# Altium footprint library ALL.PcbLib: 385 footprints (part 10 of 25)
Each footprint in its own frame and in the unit in brackets; x right, y up, seen from the top. Pads: shape width x height; smd on the part's side, far side on the other; paste and mask are expansions set on the pad; w line width, h text height; cw(c..) or ccw(c..) is an arc to the next point about the centre after c.
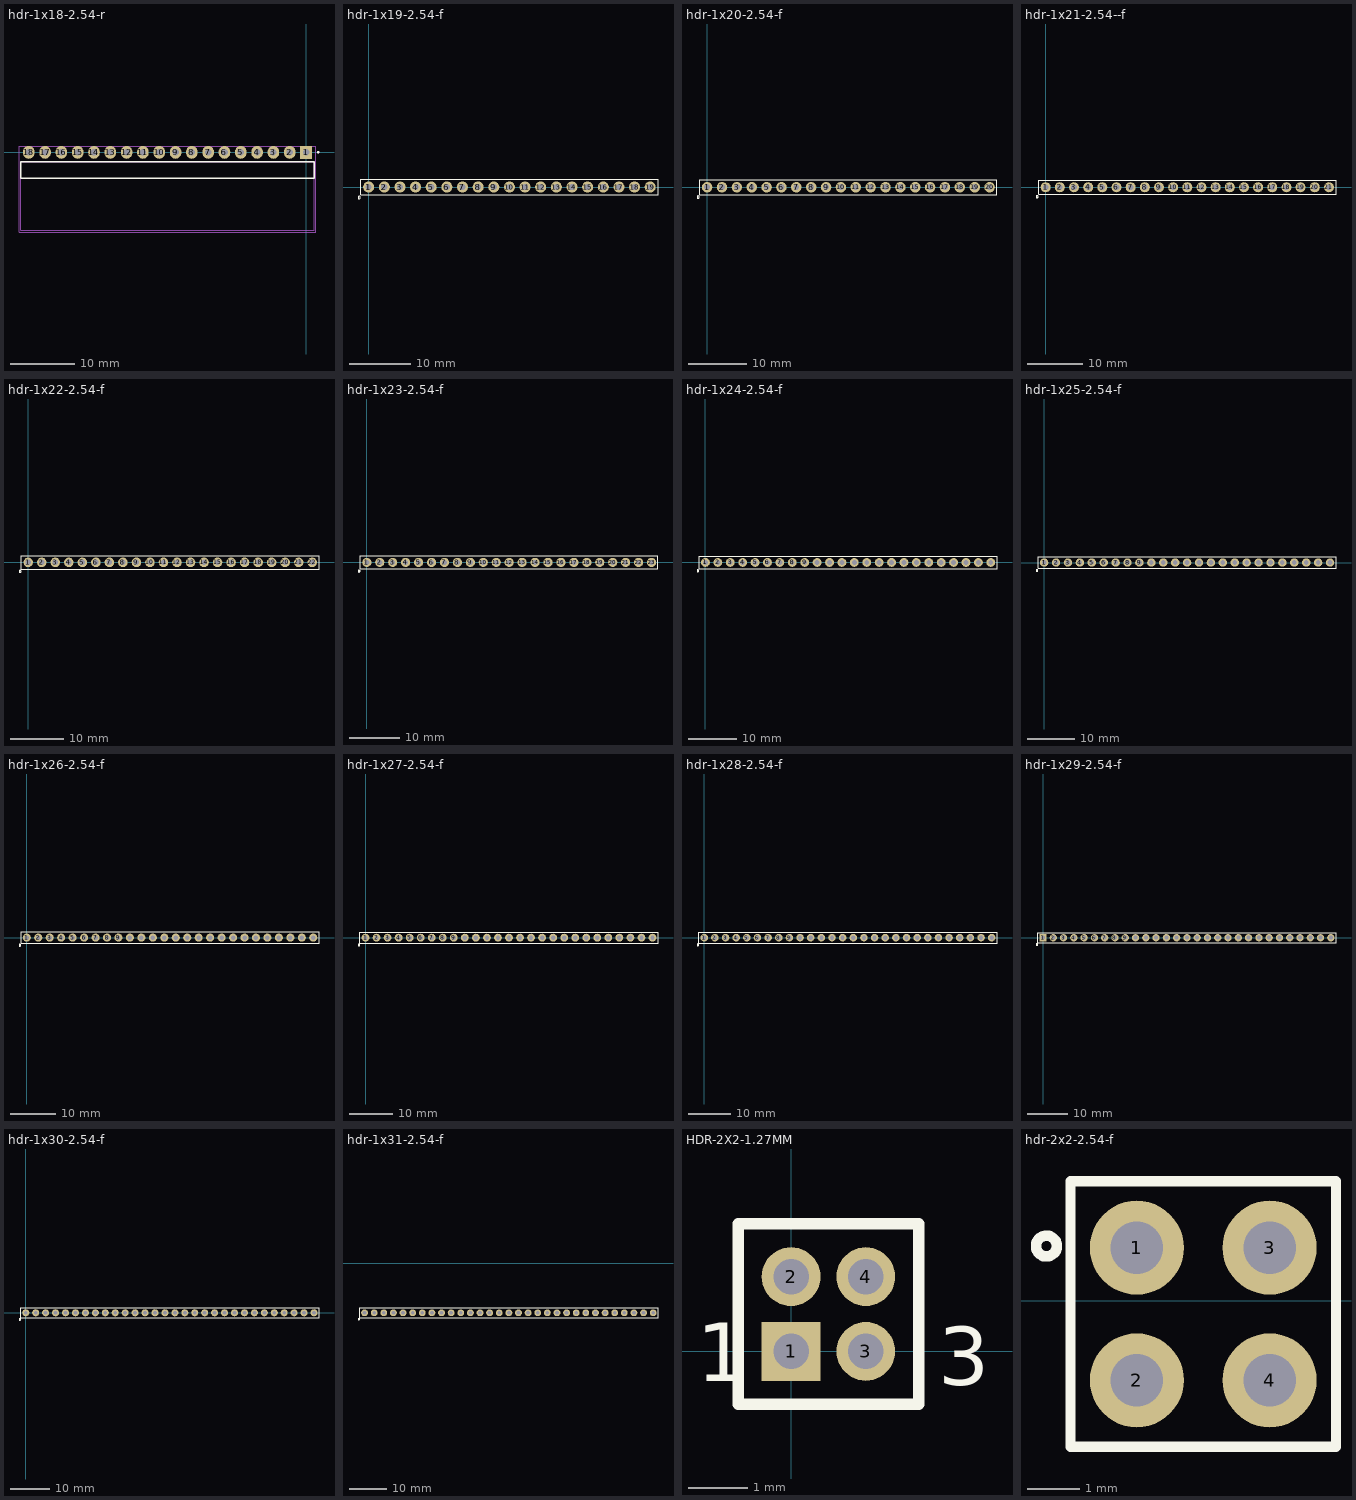
[diagram p9: the footprints below, top view; thin cyan lines are the x and y axes]

## hdr-1x18-2.54-r [mm]
pads (18):
  rect 1.8x2 hole 1.02: 1(0,0)
  oval 1.8x2 hole 1.02: 2(-2.54,0) 3(-5.08,0) 4(-7.62,0) 5(-10.16,0) 6(-12.7,0) 7(-15.24,0) 8(-17.78,0) 9(-20.32,0) 10(-22.86,0) 11(-25.4,0) 12(-27.94,0) 13(-30.48,0) 14(-33.02,0) 15(-35.56,0) 16(-38.1,0) 17(-40.64,0) 18(-43.18,0)
Top Overlay:
  circle w0.2: c1.92,0 r0.1
  lines w0.2: -44.45,-4.04 -44.45,-1.5 1.27,-1.5 1.27,-4.04 -44.45,-4.04
Mechanical 13:
  circle w0.2: c1.92,0 r0.1
  lines w0.1: -44.45,-4.04 -44.45,-1.5 1.27,-1.5 1.27,-4.04 ; -44.45,-4.04 1.27,-4.04 ; -44.45,-4.04 -44.45,-12.17 1.27,-12.17 1.27,-4.04
Mechanical 15:
  lines w0.05: -44.7,-12.42 -44.7,0.935 1.52,0.935 1.52,-12.42 -44.7,-12.42
3D body "TSW-118-16-G-S-RA.stp": height 3.27, standoff -4.83, extent -44.577,-12.065 1.143,0.445

## hdr-1x19-2.54-f [mm]
pads (19):
  round 1.8 hole 1: 1(0,0) 2(2.54,0) 3(5.08,0) 4(7.62,0) 5(10.16,0) 6(12.7,0) 7(15.24,0) 8(17.78,0) 9(20.32,0) 10(22.86,0) 11(25.4,0) 12(27.94,0) 13(30.48,0) 14(33.02,0) 15(35.56,0) 16(38.1,0) 17(40.64,0) 18(43.18,0) 19(45.72,0)
Top Overlay:
  circle w0.2: c-1.53,-1.7 r0.2
  lines w0.2: -1.27,-1.27 46.99,-1.27 46.99,1.27 -1.27,1.27 -1.27,-1.27
3D body "PBS-1.stp": height 8.5, standoff -3.15, extent 44.45,-1.27 46.99,1.27
3D body "PBD-2.stp": height 8.5, standoff -3.15, extent -1.27,-1.27 3.81,1.27
3D body "PBD-2.stp": height 8.5, standoff -3.15, extent 3.81,-1.27 8.89,1.27
3D body "PBD-2.stp": height 8.5, standoff -3.15, extent 8.89,-1.27 13.97,1.27
3D body "PBD-2.stp": height 8.5, standoff -3.15, extent 13.97,-1.27 19.05,1.27
3D body "PBD-2.stp": height 8.5, standoff -3.15, extent 19.05,-1.27 24.13,1.27
3D body "PBD-2.stp": height 8.5, standoff -3.15, extent 24.13,-1.27 29.21,1.27
3D body "PBD-2.stp": height 8.5, standoff -3.15, extent 29.21,-1.27 34.29,1.27
3D body "PBD-2.stp": height 8.5, standoff -3.15, extent 34.29,-1.27 39.37,1.27
3D body "PBD-2.stp": height 8.5, standoff -3.15, extent 39.37,-1.27 44.45,1.27

## hdr-1x20-2.54-f [mm]
pads (20):
  round 1.8 hole 1: 1(0,0) 2(2.54,0) 3(5.08,0) 4(7.62,0) 5(10.16,0) 6(12.7,0) 7(15.24,0) 8(17.78,0) 9(20.32,0) 10(22.86,0) 11(25.4,0) 12(27.94,0) 13(30.48,0) 14(33.02,0) 15(35.56,0) 16(38.1,0) 17(40.64,0) 18(43.18,0) 19(45.72,0) 20(48.26,0)
Top Overlay:
  circle w0.2: c-1.53,-1.7 r0.2
  lines w0.2: -1.27,-1.27 49.53,-1.27 49.53,1.27 -1.27,1.27 -1.27,-1.27
3D body "PBD-2.stp": height 8.5, standoff -3.15, extent -1.27,-1.27 3.81,1.27
3D body "PBD-2.stp": height 8.5, standoff -3.15, extent 3.81,-1.27 8.89,1.27
3D body "PBD-2.stp": height 8.5, standoff -3.15, extent 8.89,-1.27 13.97,1.27
3D body "PBD-2.stp": height 8.5, standoff -3.15, extent 13.97,-1.27 19.05,1.27
3D body "PBD-2.stp": height 8.5, standoff -3.15, extent 19.05,-1.27 24.13,1.27
3D body "PBD-2.stp": height 8.5, standoff -3.15, extent 24.13,-1.27 29.21,1.27
3D body "PBD-2.stp": height 8.5, standoff -3.15, extent 29.21,-1.27 34.29,1.27
3D body "PBD-2.stp": height 8.5, standoff -3.15, extent 34.29,-1.27 39.37,1.27
3D body "PBD-2.stp": height 8.5, standoff -3.15, extent 39.37,-1.27 44.45,1.27
3D body "PBD-2.stp": height 8.5, standoff -3.15, extent 44.45,-1.27 49.53,1.27

## hdr-1x21-2.54--f [mm]
pads (21):
  round 1.8 hole 1: 1(0,0) 2(2.54,0) 3(5.08,0) 4(7.62,0) 5(10.16,0) 6(12.7,0) 7(15.24,0) 8(17.78,0) 9(20.32,0) 10(22.86,0) 11(25.4,0) 12(27.94,0) 13(30.48,0) 14(33.02,0) 15(35.56,0) 16(38.1,0) 17(40.64,0) 18(43.18,0) 19(45.72,0) 20(48.26,0) 21(50.8,0)
Top Overlay:
  circle w0.2: c-1.53,-1.7 r0.2
  lines w0.2: -1.27,-1.27 52.07,-1.27 52.07,1.27 -1.27,1.27 -1.27,-1.27
3D body "PBS-1.stp": height 8.5, standoff -3.15, extent 49.53,-1.27 52.07,1.27
3D body "PBD-2.stp": height 8.5, standoff -3.15, extent -1.27,-1.27 3.81,1.27
3D body "PBD-2.stp": height 8.5, standoff -3.15, extent 3.81,-1.27 8.89,1.27
3D body "PBD-2.stp": height 8.5, standoff -3.15, extent 8.89,-1.27 13.97,1.27
3D body "PBD-2.stp": height 8.5, standoff -3.15, extent 13.97,-1.27 19.05,1.27
3D body "PBD-2.stp": height 8.5, standoff -3.15, extent 19.05,-1.27 24.13,1.27
3D body "PBD-2.stp": height 8.5, standoff -3.15, extent 24.13,-1.27 29.21,1.27
3D body "PBD-2.stp": height 8.5, standoff -3.15, extent 29.21,-1.27 34.29,1.27
3D body "PBD-2.stp": height 8.5, standoff -3.15, extent 34.29,-1.27 39.37,1.27
3D body "PBD-2.stp": height 8.5, standoff -3.15, extent 39.37,-1.27 44.45,1.27
3D body "PBD-2.stp": height 8.5, standoff -3.15, extent 44.45,-1.27 49.53,1.27

## hdr-1x22-2.54-f [mm]
pads (22):
  round 1.8 hole 1: 1(0,0) 2(2.54,0) 3(5.08,0) 4(7.62,0) 5(10.16,0) 6(12.7,0) 7(15.24,0) 8(17.78,0) 9(20.32,0) 10(22.86,0) 11(25.4,0) 12(27.94,0) 13(30.48,0) 14(33.02,0) 15(35.56,0) 16(38.1,0) 17(40.64,0) 18(43.18,0) 19(45.72,0) 20(48.26,0) 21(50.8,0) 22(53.34,0)
Top Overlay:
  circle w0.2: c-1.53,-1.7 r0.2
  lines w0.2: -1.27,-1.27 -1.27,1.27 54.61,1.27 54.61,-1.27 -1.27,-1.27
3D body "PBD-2.stp": height 8.5, standoff -3.15, extent 49.53,-1.27 54.61,1.27
3D body "PBD-2.stp": height 8.5, standoff -3.15, extent 44.45,-1.27 49.53,1.27
3D body "PBD-2.stp": height 8.5, standoff -3.15, extent 39.37,-1.27 44.45,1.27
3D body "PBD-2.stp": height 8.5, standoff -3.15, extent 34.29,-1.27 39.37,1.27
3D body "PBD-2.stp": height 8.5, standoff -3.15, extent 29.21,-1.27 34.29,1.27
3D body "PBD-2.stp": height 8.5, standoff -3.15, extent 24.13,-1.27 29.21,1.27
3D body "PBD-2.stp": height 8.5, standoff -3.15, extent 19.05,-1.27 24.13,1.27
3D body "PBD-2.stp": height 8.5, standoff -3.15, extent 13.97,-1.27 19.05,1.27
3D body "PBD-2.stp": height 8.5, standoff -3.15, extent 8.89,-1.27 13.97,1.27
3D body "PBD-2.stp": height 8.5, standoff -3.15, extent 3.81,-1.27 8.89,1.27
3D body "PBD-2.stp": height 8.5, standoff -3.15, extent -1.27,-1.27 3.81,1.27

## hdr-1x23-2.54-f [mm]
pads (23):
  round 1.8 hole 1: 1(0,0) 2(2.54,0) 3(5.08,0) 4(7.62,0) 5(10.16,0) 6(12.7,0) 7(15.24,0) 8(17.78,0) 9(20.32,0) 10(22.86,0) 11(25.4,0) 12(27.94,0) 13(30.48,0) 14(33.02,0) 15(35.56,0) 16(38.1,0) 17(40.64,0) 18(43.18,0) 19(45.72,0) 20(48.26,0) 21(50.8,0) 22(53.34,0) 23(55.88,0)
Top Overlay:
  circle w0.2: c-1.53,-1.7 r0.2
  lines w0.2: -1.27,-1.27 57.15,-1.27 57.15,1.27 -1.27,1.27 -1.27,-1.27
3D body "PBS-1.stp": height 8.5, standoff -3.15, extent 54.61,-1.27 57.15,1.27
3D body "PBD-2.stp": height 8.5, standoff -3.15, extent -1.27,-1.27 3.81,1.27
3D body "PBD-2.stp": height 8.5, standoff -3.15, extent 3.81,-1.27 8.89,1.27
3D body "PBD-2.stp": height 8.5, standoff -3.15, extent 8.89,-1.27 13.97,1.27
3D body "PBD-2.stp": height 8.5, standoff -3.15, extent 13.97,-1.27 19.05,1.27
3D body "PBD-2.stp": height 8.5, standoff -3.15, extent 19.05,-1.27 24.13,1.27
3D body "PBD-2.stp": height 8.5, standoff -3.15, extent 24.13,-1.27 29.21,1.27
3D body "PBD-2.stp": height 8.5, standoff -3.15, extent 29.21,-1.27 34.29,1.27
3D body "PBD-2.stp": height 8.5, standoff -3.15, extent 34.29,-1.27 39.37,1.27
3D body "PBD-2.stp": height 8.5, standoff -3.15, extent 39.37,-1.27 44.45,1.27
3D body "PBD-2.stp": height 8.5, standoff -3.15, extent 44.45,-1.27 49.53,1.27
3D body "PBD-2.stp": height 8.5, standoff -3.15, extent 49.53,-1.27 54.61,1.27

## hdr-1x24-2.54-f [mm]
pads (24):
  round 1.8 hole 1: 1(0,0) 2(2.54,0) 3(5.08,0) 4(7.62,0) 5(10.16,0) 6(12.7,0) 7(15.24,0) 8(17.78,0) 9(20.32,0) 10(22.86,0) 11(25.4,0) 12(27.94,0) 13(30.48,0) 14(33.02,0) 15(35.56,0) 16(38.1,0) 17(40.64,0) 18(43.18,0) 19(45.72,0) 20(48.26,0) 21(50.8,0) 22(53.34,0) 23(55.88,0) 24(58.42,0)
Top Overlay:
  circle w0.2: c-1.53,-1.7 r0.2
  lines w0.2: -1.27,-1.27 59.69,-1.27 59.69,1.27 -1.27,1.27 -1.27,-1.27
3D body "PBD-2.stp": height 8.5, standoff -3.15, extent -1.27,-1.27 3.81,1.27
3D body "PBD-2.stp": height 8.5, standoff -3.15, extent 3.81,-1.27 8.89,1.27
3D body "PBD-2.stp": height 8.5, standoff -3.15, extent 8.89,-1.27 13.97,1.27
3D body "PBD-2.stp": height 8.5, standoff -3.15, extent 13.97,-1.27 19.05,1.27
3D body "PBD-2.stp": height 8.5, standoff -3.15, extent 19.05,-1.27 24.13,1.27
3D body "PBD-2.stp": height 8.5, standoff -3.15, extent 24.13,-1.27 29.21,1.27
3D body "PBD-2.stp": height 8.5, standoff -3.15, extent 29.21,-1.27 34.29,1.27
3D body "PBD-2.stp": height 8.5, standoff -3.15, extent 34.29,-1.27 39.37,1.27
3D body "PBD-2.stp": height 8.5, standoff -3.15, extent 39.37,-1.27 44.45,1.27
3D body "PBD-2.stp": height 8.5, standoff -3.15, extent 44.45,-1.27 49.53,1.27
3D body "PBD-2.stp": height 8.5, standoff -3.15, extent 49.53,-1.27 54.61,1.27
3D body "PBD-2.stp": height 8.5, standoff -3.15, extent 54.61,-1.27 59.69,1.27

## hdr-1x25-2.54-f [mm]
pads (25):
  round 1.8 hole 1: 1(0,0) 2(2.54,0) 3(5.08,0) 4(7.62,0) 5(10.16,0) 6(12.7,0) 7(15.24,0) 8(17.78,0) 9(20.32,0) 10(22.86,0) 11(25.4,0) 12(27.94,0) 13(30.48,0) 14(33.02,0) 15(35.56,0) 16(38.1,0) 17(40.64,0) 18(43.18,0) 19(45.72,0) 20(48.26,0) 21(50.8,0) 22(53.34,0) 23(55.88,0) 24(58.42,0) 25(60.96,0)
Top Overlay:
  circle w0.2: c-1.53,-1.7 r0.2
  lines w0.2: -1.27,-1.27 62.23,-1.27 62.23,1.27 -1.27,1.27 -1.27,-1.27
3D body "PBD-2.stp": height 8.5, standoff -3.15, extent 54.61,-1.27 59.69,1.27
3D body "PBD-2.stp": height 8.5, standoff -3.15, extent 49.53,-1.27 54.61,1.27
3D body "PBD-2.stp": height 8.5, standoff -3.15, extent 44.45,-1.27 49.53,1.27
3D body "PBD-2.stp": height 8.5, standoff -3.15, extent 39.37,-1.27 44.45,1.27
3D body "PBD-2.stp": height 8.5, standoff -3.15, extent 34.29,-1.27 39.37,1.27
3D body "PBD-2.stp": height 8.5, standoff -3.15, extent 29.21,-1.27 34.29,1.27
3D body "PBD-2.stp": height 8.5, standoff -3.15, extent 24.13,-1.27 29.21,1.27
3D body "PBD-2.stp": height 8.5, standoff -3.15, extent 19.05,-1.27 24.13,1.27
3D body "PBD-2.stp": height 8.5, standoff -3.15, extent 13.97,-1.27 19.05,1.27
3D body "PBD-2.stp": height 8.5, standoff -3.15, extent 8.89,-1.27 13.97,1.27
3D body "PBD-2.stp": height 8.5, standoff -3.15, extent 3.81,-1.27 8.89,1.27
3D body "PBD-2.stp": height 8.5, standoff -3.15, extent -1.27,-1.27 3.81,1.27
3D body "PBS-1.stp": height 8.5, standoff -3.15, extent 59.69,-1.27 62.23,1.27

## hdr-1x26-2.54-f [mm]
pads (26):
  round 1.8 hole 1: 1(0,0) 2(2.54,0) 3(5.08,0) 4(7.62,0) 5(10.16,0) 6(12.7,0) 7(15.24,0) 8(17.78,0) 9(20.32,0) 10(22.86,0) 11(25.4,0) 12(27.94,0) 13(30.48,0) 14(33.02,0) 15(35.56,0) 16(38.1,0) 17(40.64,0) 18(43.18,0) 19(45.72,0) 20(48.26,0) 21(50.8,0) 22(53.34,0) 23(55.88,0) 24(58.42,0) 25(60.96,0) 26(63.5,0)
Top Overlay:
  circle w0.2: c-1.53,-1.7 r0.2
  lines w0.2: -1.27,-1.27 -1.27,1.27 64.77,1.27 64.77,-1.27 -1.27,-1.27
3D body "PBD-2.stp": height 8.5, standoff -3.15, extent 59.69,-1.27 64.77,1.27
3D body "PBD-2.stp": height 8.5, standoff -3.15, extent 54.61,-1.27 59.69,1.27
3D body "PBD-2.stp": height 8.5, standoff -3.15, extent 49.53,-1.27 54.61,1.27
3D body "PBD-2.stp": height 8.5, standoff -3.15, extent 44.45,-1.27 49.53,1.27
3D body "PBD-2.stp": height 8.5, standoff -3.15, extent 39.37,-1.27 44.45,1.27
3D body "PBD-2.stp": height 8.5, standoff -3.15, extent 34.29,-1.27 39.37,1.27
3D body "PBD-2.stp": height 8.5, standoff -3.15, extent 29.21,-1.27 34.29,1.27
3D body "PBD-2.stp": height 8.5, standoff -3.15, extent 24.13,-1.27 29.21,1.27
3D body "PBD-2.stp": height 8.5, standoff -3.15, extent 19.05,-1.27 24.13,1.27
3D body "PBD-2.stp": height 8.5, standoff -3.15, extent 13.97,-1.27 19.05,1.27
3D body "PBD-2.stp": height 8.5, standoff -3.15, extent 8.89,-1.27 13.97,1.27
3D body "PBD-2.stp": height 8.5, standoff -3.15, extent 3.81,-1.27 8.89,1.27
3D body "PBD-2.stp": height 8.5, standoff -3.15, extent -1.27,-1.27 3.81,1.27

## hdr-1x27-2.54-f [mm]
pads (27):
  round 1.8 hole 1: 1(0,0) 2(2.54,0) 3(5.08,0) 4(7.62,0) 5(10.16,0) 6(12.7,0) 7(15.24,0) 8(17.78,0) 9(20.32,0) 10(22.86,0) 11(25.4,0) 12(27.94,0) 13(30.48,0) 14(33.02,0) 15(35.56,0) 16(38.1,0) 17(40.64,0) 18(43.18,0) 19(45.72,0) 20(48.26,0) 21(50.8,0) 22(53.34,0) 23(55.88,0) 24(58.42,0) 25(60.96,0) 26(63.5,0) 27(66.04,0)
Top Overlay:
  circle w0.2: c-1.53,-1.7 r0.2
  lines w0.2: -1.27,-1.27 -1.27,1.27 67.31,1.27 67.31,-1.27 -1.27,-1.27
3D body "PBD-2.stp": height 8.5, standoff -3.15, extent -1.27,-1.27 3.81,1.27
3D body "PBD-2.stp": height 8.5, standoff -3.15, extent 3.81,-1.27 8.89,1.27
3D body "PBD-2.stp": height 8.5, standoff -3.15, extent 8.89,-1.27 13.97,1.27
3D body "PBD-2.stp": height 8.5, standoff -3.15, extent 13.97,-1.27 19.05,1.27
3D body "PBD-2.stp": height 8.5, standoff -3.15, extent 19.05,-1.27 24.13,1.27
3D body "PBD-2.stp": height 8.5, standoff -3.15, extent 24.13,-1.27 29.21,1.27
3D body "PBD-2.stp": height 8.5, standoff -3.15, extent 29.21,-1.27 34.29,1.27
3D body "PBD-2.stp": height 8.5, standoff -3.15, extent 34.29,-1.27 39.37,1.27
3D body "PBD-2.stp": height 8.5, standoff -3.15, extent 39.37,-1.27 44.45,1.27
3D body "PBD-2.stp": height 8.5, standoff -3.15, extent 44.45,-1.27 49.53,1.27
3D body "PBD-2.stp": height 8.5, standoff -3.15, extent 49.53,-1.27 54.61,1.27
3D body "PBD-2.stp": height 8.5, standoff -3.15, extent 54.61,-1.27 59.69,1.27
3D body "PBD-2.stp": height 8.5, standoff -3.15, extent 59.69,-1.27 64.77,1.27
3D body "PBS-1.stp": height 8.5, standoff -3.15, extent 64.77,-1.27 67.31,1.27

## hdr-1x28-2.54-f [mm]
pads (28):
  round 1.8 hole 1: 1(0,0) 2(2.54,0) 3(5.08,0) 4(7.62,0) 5(10.16,0) 6(12.7,0) 7(15.24,0) 8(17.78,0) 9(20.32,0) 10(22.86,0) 11(25.4,0) 12(27.94,0) 13(30.48,0) 14(33.02,0) 15(35.56,0) 16(38.1,0) 17(40.64,0) 18(43.18,0) 19(45.72,0) 20(48.26,0) 21(50.8,0) 22(53.34,0) 23(55.88,0) 24(58.42,0) 25(60.96,0) 26(63.5,0) 27(66.04,0) 28(68.58,0)
Top Overlay:
  circle w0.2: c-1.53,-1.7 r0.2
  lines w0.2: -1.27,-1.27 -1.27,1.27 69.85,1.27 69.85,-1.27 -1.27,-1.27
3D body "PBD-2.stp": height 8.5, standoff -3.15, extent 64.77,-1.27 69.85,1.27
3D body "PBD-2.stp": height 8.5, standoff -3.15, extent 59.69,-1.27 64.77,1.27
3D body "PBD-2.stp": height 8.5, standoff -3.15, extent 54.61,-1.27 59.69,1.27
3D body "PBD-2.stp": height 8.5, standoff -3.15, extent 49.53,-1.27 54.61,1.27
3D body "PBD-2.stp": height 8.5, standoff -3.15, extent 44.45,-1.27 49.53,1.27
3D body "PBD-2.stp": height 8.5, standoff -3.15, extent 39.37,-1.27 44.45,1.27
3D body "PBD-2.stp": height 8.5, standoff -3.15, extent 34.29,-1.27 39.37,1.27
3D body "PBD-2.stp": height 8.5, standoff -3.15, extent 29.21,-1.27 34.29,1.27
3D body "PBD-2.stp": height 8.5, standoff -3.15, extent 24.13,-1.27 29.21,1.27
3D body "PBD-2.stp": height 8.5, standoff -3.15, extent 19.05,-1.27 24.13,1.27
3D body "PBD-2.stp": height 8.5, standoff -3.15, extent 13.97,-1.27 19.05,1.27
3D body "PBD-2.stp": height 8.5, standoff -3.15, extent 8.89,-1.27 13.97,1.27
3D body "PBD-2.stp": height 8.5, standoff -3.15, extent 3.81,-1.27 8.89,1.27
3D body "PBD-2.stp": height 8.5, standoff -3.15, extent -1.27,-1.27 3.81,1.27

## hdr-1x29-2.54-f [mm]
pads (29):
  rect 1.8x1.8 hole 1: 1(0,0)
  round 1.8 hole 1: 2(2.54,0) 3(5.08,0) 4(7.62,0) 5(10.16,0) 6(12.7,0) 7(15.24,0) 8(17.78,0) 9(20.32,0) 10(22.86,0) 11(25.4,0) 12(27.94,0) 13(30.48,0) 14(33.02,0) 15(35.56,0) 16(38.1,0) 17(40.64,0) 18(43.18,0) 19(45.72,0) 20(48.26,0) 21(50.8,0) 22(53.34,0) 23(55.88,0) 24(58.42,0) 25(60.96,0) 26(63.5,0) 27(66.04,0) 28(68.58,0) 29(71.12,0)
Top Overlay:
  circle w0.2: c-1.53,-1.7 r0.2
  lines w0.2: -1.27,-1.27 -1.27,1.27 72.39,1.27 72.39,-1.27 -1.27,-1.27
3D body "PBD-2.stp": height 8.5, standoff -3.15, extent 64.77,-1.27 69.85,1.27
3D body "PBD-2.stp": height 8.5, standoff -3.15, extent 59.69,-1.27 64.77,1.27
3D body "PBD-2.stp": height 8.5, standoff -3.15, extent 54.61,-1.27 59.69,1.27
3D body "PBD-2.stp": height 8.5, standoff -3.15, extent 49.53,-1.27 54.61,1.27
3D body "PBD-2.stp": height 8.5, standoff -3.15, extent 44.45,-1.27 49.53,1.27
3D body "PBD-2.stp": height 8.5, standoff -3.15, extent 39.37,-1.27 44.45,1.27
3D body "PBD-2.stp": height 8.5, standoff -3.15, extent 34.29,-1.27 39.37,1.27
3D body "PBD-2.stp": height 8.5, standoff -3.15, extent 29.21,-1.27 34.29,1.27
3D body "PBD-2.stp": height 8.5, standoff -3.15, extent 24.13,-1.27 29.21,1.27
3D body "PBD-2.stp": height 8.5, standoff -3.15, extent 19.05,-1.27 24.13,1.27
3D body "PBD-2.stp": height 8.5, standoff -3.15, extent 13.97,-1.27 19.05,1.27
3D body "PBD-2.stp": height 8.5, standoff -3.15, extent 8.89,-1.27 13.97,1.27
3D body "PBD-2.stp": height 8.5, standoff -3.15, extent 3.81,-1.27 8.89,1.27
3D body "PBD-2.stp": height 8.5, standoff -3.15, extent -1.27,-1.27 3.81,1.27
3D body "PBS-1.stp": height 8.5, standoff -3.15, extent 69.85,-1.27 72.39,1.27

## hdr-1x30-2.54-f [mm]
pads (30):
  round 1.8 hole 1: 1(0,0) 2(2.54,0) 3(5.08,0) 4(7.62,0) 5(10.16,0) 6(12.7,0) 7(15.24,0) 8(17.78,0) 9(20.32,0) 10(22.86,0) 11(25.4,0) 12(27.94,0) 13(30.48,0) 14(33.02,0) 15(35.56,0) 16(38.1,0) 17(40.64,0) 18(43.18,0) 19(45.72,0) 20(48.26,0) 21(50.8,0) 22(53.34,0) 23(55.88,0) 24(58.42,0) 25(60.96,0) 26(63.5,0) 27(66.04,0) 28(68.58,0) 29(71.12,0) 30(73.66,0)
Top Overlay:
  circle w0.2: c-1.53,-1.7 r0.2
  lines w0.2: -1.27,-1.27 74.93,-1.27 74.93,1.27 -1.27,1.27 -1.27,-1.27
3D body "PBD-2.stp": height 8.5, standoff -3.15, extent -1.27,-1.27 3.81,1.27
3D body "PBD-2.stp": height 8.5, standoff -3.15, extent 3.81,-1.27 8.89,1.27
3D body "PBD-2.stp": height 8.5, standoff -3.15, extent 8.89,-1.27 13.97,1.27
3D body "PBD-2.stp": height 8.5, standoff -3.15, extent 13.97,-1.27 19.05,1.27
3D body "PBD-2.stp": height 8.5, standoff -3.15, extent 19.05,-1.27 24.13,1.27
3D body "PBD-2.stp": height 8.5, standoff -3.15, extent 24.13,-1.27 29.21,1.27
3D body "PBD-2.stp": height 8.5, standoff -3.15, extent 29.21,-1.27 34.29,1.27
3D body "PBD-2.stp": height 8.5, standoff -3.15, extent 34.29,-1.27 39.37,1.27
3D body "PBD-2.stp": height 8.5, standoff -3.15, extent 39.37,-1.27 44.45,1.27
3D body "PBD-2.stp": height 8.5, standoff -3.15, extent 44.45,-1.27 49.53,1.27
3D body "PBD-2.stp": height 8.5, standoff -3.15, extent 49.53,-1.27 54.61,1.27
3D body "PBD-2.stp": height 8.5, standoff -3.15, extent 54.61,-1.27 59.69,1.27
3D body "PBD-2.stp": height 8.5, standoff -3.15, extent 59.69,-1.27 64.77,1.27
3D body "PBD-2.stp": height 8.5, standoff -3.15, extent 64.77,-1.27 69.85,1.27
3D body "PBD-2.stp": height 8.5, standoff -3.15, extent 69.85,-1.27 74.93,1.27

## hdr-1x31-2.54-f [mm]
pads (31):
  round 1.8 hole 1: 1(-261.874,-13.106) 2(-259.334,-13.106) 3(-256.794,-13.106) 4(-254.254,-13.106) 5(-251.714,-13.106) 6(-249.174,-13.106) 7(-246.634,-13.106) 8(-244.094,-13.106) 9(-241.554,-13.106) 10(-239.014,-13.106) 11(-236.474,-13.106) 12(-233.934,-13.106) 13(-231.394,-13.106) 14(-228.854,-13.106) 15(-226.314,-13.106) 16(-223.774,-13.106) 17(-221.234,-13.106) 18(-218.694,-13.106) 19(-216.154,-13.106) 20(-213.614,-13.106) 21(-211.074,-13.106) 22(-208.534,-13.106) 23(-205.994,-13.106) 24(-203.454,-13.106) 25(-200.914,-13.106) 26(-198.374,-13.106) 27(-195.834,-13.106) 28(-193.294,-13.106) 29(-190.754,-13.106) 30(-188.214,-13.106) 31(-185.674,-13.106)
Top Overlay:
  circle w0.2: c-263.404,-14.806 r0.2
  lines w0.2: -263.144,-14.376 -263.144,-11.836 -184.404,-11.836 -184.404,-14.376 -263.144,-14.376
3D body "PBD-2.stp": height 8.5, standoff -3.15, extent -192.024,-14.376 -186.944,-11.836
3D body "PBD-2.stp": height 8.5, standoff -3.15, extent -197.104,-14.376 -192.024,-11.836
3D body "PBD-2.stp": height 8.5, standoff -3.15, extent -202.184,-14.376 -197.104,-11.836
3D body "PBD-2.stp": height 8.5, standoff -3.15, extent -207.264,-14.376 -202.184,-11.836
3D body "PBD-2.stp": height 8.5, standoff -3.15, extent -212.344,-14.376 -207.264,-11.836
3D body "PBD-2.stp": height 8.5, standoff -3.15, extent -217.424,-14.376 -212.344,-11.836
3D body "PBD-2.stp": height 8.5, standoff -3.15, extent -222.504,-14.376 -217.424,-11.836
3D body "PBD-2.stp": height 8.5, standoff -3.15, extent -227.584,-14.376 -222.504,-11.836
3D body "PBD-2.stp": height 8.5, standoff -3.15, extent -232.664,-14.376 -227.584,-11.836
3D body "PBD-2.stp": height 8.5, standoff -3.15, extent -237.744,-14.376 -232.664,-11.836
3D body "PBD-2.stp": height 8.5, standoff -3.15, extent -242.824,-14.376 -237.744,-11.836
3D body "PBD-2.stp": height 8.5, standoff -3.15, extent -247.904,-14.376 -242.824,-11.836
3D body "PBD-2.stp": height 8.5, standoff -3.15, extent -252.984,-14.376 -247.904,-11.836
3D body "PBD-2.stp": height 8.5, standoff -3.15, extent -258.064,-14.376 -252.984,-11.836
3D body "PBD-2.stp": height 8.5, standoff -3.15, extent -263.144,-14.376 -258.064,-11.836
3D body "PBS-1.stp": height 8.5, standoff -3.15, extent -186.944,-14.376 -184.404,-11.836

## HDR-2X2-1.27MM [mm]
pads (4):
  rect 1x1 hole 0.6: 1(0,0)
  round 1 hole 0.6: 2(0,1.27) 3(1.27,0) 4(1.27,1.27)
Top Overlay:
  lines w0.2: -0.9,-0.9 -0.9,2.17 2.17,2.17 2.17,-0.9 -0.9,-0.9
  text "1" at -1.6,-0.508 h1
  text "3" at 2.5,-0.578 h1
3D body "User Library-PLLD1_27-xx.STEP": height 4.7, standoff -2.6, extent -0.865,-0.609 2.135,1.931

## hdr-2x2-2.54-f [mm]
pads (4):
  round 1.8 hole 1: 1(20.244,1.016) 2(20.244,-1.524) 3(22.784,1.016) 4(22.784,-1.524)
Top Overlay:
  circle w0.2: c18.514,1.046 r0.2
  lines w0.2: 18.974,-2.794 24.054,-2.794 24.054,2.286 18.974,2.286 18.974,-2.794
3D body "PBD-2.stp": height 8.5, standoff -3.15, extent 18.974,-2.794 21.514,2.286
3D body "PBD-2.stp": height 8.5, standoff -3.15, extent 21.514,-2.794 24.054,2.286